# Altium footprint library 7-Connectors-7.PcbLib: 35 footprints (part 4 of 4) (continued)
## SAMTEC_ASP-134603-01 [mm] "Connector VITA 57 (Low Pin Count version), 160 Female contacts in 4 row cdgh" (continued)
  text "e" at 29.949,-0.836 h1
  text "d" at 29.989,-2.392 h1
  text "c" at 29.972,-3.556 h1
  text "b" at 29.972,-4.826 h1
  text "a" at 29.972,-6.096 h1
  text "f" at 30.116,0.436 h1
  text "h" at 29.972,2.921 h1
  text "g" at 29.862,1.579 h1
  text "j" at 29.989,4.246 h1
  text "k" at 29.989,5.516 h1
  text "40" at -26.289,-5.461 h1.2
  text "1" at 25.29,-7.438 h1
Mechanical 8:
  drawing of 1618 lines, arcs and shapes, not listed
Mechanical 14:
  drawing of 1424 lines, arcs and shapes, not listed
  text "a" at 29.972,-6.096 h1
  text "b" at 29.972,-4.826 h1
  text "c" at 29.972,-3.556 h1
  text "d" at 29.989,-2.392 h1
  text "e" at 29.949,-0.836 h1
  text "f" at 30.116,0.436 h1
  text "h" at 29.972,2.921 h1
  text "g" at 29.862,1.579 h1
  text "j" at 29.989,4.246 h1
  text "k" at 29.989,5.516 h1
  text "40" at -26.289,-5.461 h1.2
  text "1" at 25.29,-7.438 h1
3D body "SAMTEC_ASP-134603-01.stp": height 6.55, standoff -1.27, extent -28.727,-6.618 28.727,6.618

## SAMTEC_ASP-134604-01 [mm] "Connector VITA 57, 160 Male contacts in 4 row cdgh"
height 6.1
pads (162):
  round 1 hole 1.3 unplated mask+0.3: 1(-27.191,-3.048) 2(27.191,0)
  round 0.64 smd: c1(24.765,3.175) c2(23.495,3.175) c3(22.225,3.175) c4(20.955,3.175) c5(19.685,3.175) c6(18.415,3.175) c7(17.145,3.175) c8(15.875,3.175) c9(14.605,3.175) c10(13.335,3.175) c11(12.065,3.175) c12(10.795,3.175) c13(9.525,3.175) c14(8.255,3.175) c15(6.985,3.175) c16(5.715,3.175) c17(4.445,3.175) c18(3.175,3.175) c19(1.905,3.175) c20(0.635,3.175) c21(-0.635,3.175) c22(-1.905,3.175) c23(-3.175,3.175) c24(-4.445,3.175) c25(-5.715,3.175) c26(-6.985,3.175) c27(-8.255,3.175) c28(-9.525,3.175) c29(-10.795,3.175) c30(-12.065,3.175) c31(-13.335,3.175) c32(-14.605,3.175) c33(-15.875,3.175) c34(-17.145,3.175) c35(-18.415,3.175) c36(-19.685,3.175) c37(-20.955,3.175) c38(-22.225,3.175) c39(-23.495,3.175) c40(-24.765,3.175) d1(24.765,1.905) d2(23.495,1.905) d3(22.225,1.905) d4(20.955,1.905) d5(19.685,1.905) d6(18.415,1.905) d7(17.145,1.905) d8(15.875,1.905) d9(14.605,1.905) d10(13.335,1.905) d11(12.065,1.905) d12(10.795,1.905) d13(9.525,1.905) d14(8.255,1.905) d15(6.985,1.905) d16(5.715,1.905) d17(4.445,1.905) d18(3.175,1.905) d19(1.905,1.905) d20(0.635,1.905) d21(-0.635,1.905) d22(-1.905,1.905) d23(-3.175,1.905) d24(-4.445,1.905) d25(-5.715,1.905) d26(-6.985,1.905) d27(-8.255,1.905) d28(-9.525,1.905) d29(-10.795,1.905) d30(-12.065,1.905) d31(-13.335,1.905) d32(-14.605,1.905) d33(-15.875,1.905) d34(-17.145,1.905) d35(-18.415,1.905) d36(-19.685,1.905) d37(-20.955,1.905) d38(-22.225,1.905) d39(-23.495,1.905) d40(-24.765,1.905) g1(24.765,-1.905) g2(23.495,-1.905) g3(22.225,-1.905) g4(20.955,-1.905) g5(19.685,-1.905) g6(18.415,-1.905) g7(17.145,-1.905) g8(15.875,-1.905) g9(14.605,-1.905) g10(13.335,-1.905) g11(12.065,-1.905) g12(10.795,-1.905) g13(9.525,-1.905) g14(8.255,-1.905) g15(6.985,-1.905) g16(5.715,-1.905) g17(4.445,-1.905) g18(3.175,-1.905) g19(1.905,-1.905) g20(0.635,-1.905) g21(-0.635,-1.905) g22(-1.905,-1.905) g23(-3.175,-1.905) g24(-4.445,-1.905) g25(-5.715,-1.905) g26(-6.985,-1.905) g27(-8.255,-1.905) g28(-9.525,-1.905) g29(-10.795,-1.905) g30(-12.065,-1.905) g31(-13.335,-1.905) g32(-14.605,-1.905) g33(-15.875,-1.905) g34(-17.145,-1.905) g35(-18.415,-1.905) g36(-19.685,-1.905) g37(-20.955,-1.905) g38(-22.225,-1.905) g39(-23.495,-1.905) g40(-24.765,-1.905) h1(24.765,-3.175) h2(23.495,-3.175) h3(22.225,-3.175) h4(20.955,-3.175) h5(19.685,-3.175) h6(18.415,-3.175) h7(17.145,-3.175) h8(15.875,-3.175) h9(14.605,-3.175) h10(13.335,-3.175) h11(12.065,-3.175) h12(10.795,-3.175) h13(9.525,-3.175) h14(8.255,-3.175) h15(6.985,-3.175) h16(5.715,-3.175) h17(4.445,-3.175) h18(3.175,-3.175) h19(1.905,-3.175) h20(0.635,-3.175) h21(-0.635,-3.175) h22(-1.905,-3.175) h23(-3.175,-3.175) h24(-4.445,-3.175) h25(-5.715,-3.175) h26(-6.985,-3.175) h27(-8.255,-3.175) h28(-9.525,-3.175) h29(-10.795,-3.175) h30(-12.065,-3.175) h31(-13.335,-3.175) h32(-14.605,-3.175) h33(-15.875,-3.175) h34(-17.145,-3.175) h35(-18.415,-3.175) h36(-19.685,-3.175) h37(-20.955,-3.175) h38(-22.225,-3.175) h39(-23.495,-3.175) h40(-24.765,-3.175)
Top Overlay:
  drawing of 605 lines, arcs and shapes, not listed
  text "d" at 29.989,1.545 h1
  text "c" at 29.972,2.921 h1
  text "h" at 29.972,-3.556 h1
  text "g" at 29.862,-2.231 h1
  text "40" at -27.305,-7.112 h1
  text "1" at 25.417,-8.073 h1
Mechanical 8:
  drawing of 648 lines, arcs and shapes, not listed
Mechanical 14:
  drawing of 4433 lines, arcs and shapes, not listed
  text "c" at 29.972,2.921 h1
  text "d" at 29.989,1.545 h1
  text "h" at 29.972,-3.556 h1
  text "g" at 29.862,-2.231 h1
  text "40" at -27.305,-7.112 h1
  text "1" at 25.417,-8.073 h1
3D body "SAMTEC_ASP-134604-01.stp": height 5.61, standoff -1.27, extent -27.889,-7.341 28.778,7.341

## SAMTEC_SEAM-30-01-L-06-2-RA-TR [mm] "180 Contacts in 6 rows  (30 Pin per Row), Hi-Density Right Angle Open Pin Field Connector"
height 10.59
pads (186):
  rrect100% 0.84x0.64 smd: 1(-18.085,-0.762) 2(-18.085,1.397) 3(-18.085,2.667) 4(-18.085,3.937) 5(-18.085,5.207) 6(-18.085,6.477) 7(-16.815,-0.762) 8(-16.815,1.397) 9(-16.815,2.667) 10(-16.815,3.937) 11(-16.815,5.207) 12(-16.815,6.477) 13(-15.545,-0.762) 14(-15.545,1.397) 15(-15.545,2.667) 16(-15.545,3.937) 17(-15.545,5.207) 18(-15.545,6.477) 19(-14.275,-0.762) 20(-14.275,1.397) 21(-14.275,2.667) 22(-14.275,3.937) 23(-14.275,5.207) 24(-14.275,6.477) 25(-13.005,-0.762) 26(-13.005,1.397) 27(-13.005,2.667) 28(-13.005,3.937) 29(-13.005,5.207) 30(-13.005,6.477) 31(-11.735,-0.762) 32(-11.735,1.397) 33(-11.735,2.667) 34(-11.735,3.937) 35(-11.735,5.207) 36(-11.735,6.477) 37(-10.465,-0.762) 38(-10.465,1.397) 39(-10.465,2.667) 40(-10.465,3.937) 41(-10.465,5.207) 42(-10.465,6.477) 43(-9.195,-0.762) 44(-9.195,1.397) 45(-9.195,2.667) 46(-9.195,3.937) 47(-9.195,5.207) 48(-9.195,6.477) 49(-7.925,-0.762) 50(-7.925,1.397) 51(-7.925,2.667) 52(-7.925,3.937) 53(-7.925,5.207) 54(-7.925,6.477) 55(-6.655,-0.762) 56(-6.655,1.397) 57(-6.655,2.667) 58(-6.655,3.937) 59(-6.655,5.207) 60(-6.655,6.477) 61(-5.385,-0.762) 62(-5.385,1.397) 63(-5.385,2.667) 64(-5.385,3.937) 65(-5.385,5.207) 66(-5.385,6.477) 67(-4.115,-0.762) 68(-4.115,1.397) 69(-4.115,2.667) 70(-4.115,3.937) 71(-4.115,5.207) 72(-4.115,6.477) 73(-2.845,-0.762) 74(-2.845,1.397) 75(-2.845,2.667) 76(-2.845,3.937) 77(-2.845,5.207) 78(-2.845,6.477) 79(-1.575,-0.762) 80(-1.575,1.397) 81(-1.575,2.667) 82(-1.575,3.937) 83(-1.575,5.207) 84(-1.575,6.477) 85(-0.305,-0.762) 86(-0.305,1.397) 87(-0.305,2.667) 88(-0.305,3.937) 89(-0.305,5.207) 90(-0.305,6.477) 91(0.965,-0.762) 92(0.965,1.397) 93(0.965,2.667) 94(0.965,3.937) 95(0.965,5.207) 96(0.965,6.477) 97(2.235,-0.762) 98(2.235,1.397) 99(2.235,2.667) 100(2.235,3.937) 101(2.235,5.207) 102(2.235,6.477) 103(3.505,-0.762) 104(3.505,1.397) 105(3.505,2.667) 106(3.505,3.937) 107(3.505,5.207) 108(3.505,6.477) 109(4.775,-0.762) 110(4.775,1.397) 111(4.775,2.667) 112(4.775,3.937) 113(4.775,5.207) 114(4.775,6.477) 115(6.045,-0.762) 116(6.045,1.397) 117(6.045,2.667) 118(6.045,3.937) 119(6.045,5.207) 120(6.045,6.477) 121(7.315,-0.762) 122(7.315,1.397) 123(7.315,2.667) 124(7.315,3.937) 125(7.315,5.207) 126(7.315,6.477) 127(8.585,-0.762) 128(8.585,1.397) 129(8.585,2.667) 130(8.585,3.937) 131(8.585,5.207) 132(8.585,6.477) 133(9.855,-0.762) 134(9.855,1.397) 135(9.855,2.667) 136(9.855,3.937) 137(9.855,5.207) 138(9.855,6.477) 139(11.125,-0.762) 140(11.125,1.397) 141(11.125,2.667) 142(11.125,3.937) 143(11.125,5.207) 144(11.125,6.477) 145(12.395,-0.762) 146(12.395,1.397) 147(12.395,2.667) 148(12.395,3.937) 149(12.395,5.207) 150(12.395,6.477) 151(13.665,-0.762) 152(13.665,1.397) 153(13.665,2.667) 154(13.665,3.937) 155(13.665,5.207) 156(13.665,6.477) 157(14.935,-0.762) 158(14.935,1.397) 159(14.935,2.667) 160(14.935,3.937) 161(14.935,5.207) 162(14.935,6.477) 163(16.205,-0.762) 164(16.205,1.397) 165(16.205,2.667) 166(16.205,3.937) 167(16.205,5.207) 168(16.205,6.477) 169(17.475,-0.762) 170(17.475,1.397) 171(17.475,2.667) 172(17.475,3.937) 173(17.475,5.207) 174(17.475,6.477) 175(18.745,-0.762) 176(18.745,1.397) 177(18.745,2.667) 178(18.745,3.937) 179(18.745,5.207) 180(18.745,6.477)
  round 1 hole 1.3 unplated mask+0.15: MEC1(-21.715,0) MEC2(21.715,0)
  round 1 hole 1.15 unplated mask+0.075: MEC3(-22.735,5.134) MEC4(-22.735,-2.616) MEC5(22.735,5.134) MEC6(22.735,-2.616)
Top Overlay:
  drawing of 197 lines, arcs and shapes, not listed
  text "6" at -18.353,7.72 h1.2
  text "180" at 16.177,7.62 h1.2
  text "175" at 16.177,-2.98 h1.2
  text "1" at -18.253,-3.08 h1.2
Mechanical 8:
  drawing of 1656 lines, arcs and shapes, not listed
Mechanical 14:
  drawing of 286 lines, arcs and shapes, not listed
  text "6" at -18.353,7.72 h1.2
  text "180" at 16.177,7.62 h1.2
  text "175" at 16.177,-2.98 h1.2
  text "1" at -18.253,-3.08 h1.2
Mechanical 15:
  lines w0.05: -24.888,-9.077 -24.888,7.298 20.194,7.298 20.238,8.568 22.484,8.568 22.529,7.298 24.888,7.298 24.888,-9.077 -24.888,-9.077
3D body "SAMTEC_SEAM-30-01-L-06-2-RA-TR.stp": height 10.57, standoff -1.51, extent -24.638,-8.826 24.638,8.319

## SAMTEC_SEAM-30-03.0-L-06-2-A-K-TR [mm] "PISMO 2, VITA 57, VITA 57 Standard, 6 rows x 30 Columns, 180 contacts Male Connector"
height 6.6
pads (182):
  round 0.64 smd: 1(18.415,3.175) 2(18.415,1.905) 3(18.415,0.635) 4(18.415,-0.635) 5(18.415,-1.905) 6(18.415,-3.175) 7(17.145,3.175) 8(17.145,1.905) 9(17.145,0.635) 10(17.145,-0.635) 11(17.145,-1.905) 12(17.145,-3.175) 13(15.875,3.175) 14(15.875,1.905) 15(15.875,0.635) 16(15.875,-0.635) 17(15.875,-1.905) 18(15.875,-3.175) 19(14.605,3.175) 20(14.605,1.905) 21(14.605,0.635) 22(14.605,-0.635) 23(14.605,-1.905) 24(14.605,-3.175) 25(13.335,3.175) 26(13.335,1.905) 27(13.335,0.635) 28(13.335,-0.635) 29(13.335,-1.905) 30(13.335,-3.175) 31(12.065,3.175) 32(12.065,1.905) 33(12.065,0.635) 34(12.065,-0.635) 35(12.065,-1.905) 36(12.065,-3.175) 37(10.795,3.175) 38(10.795,1.905) 39(10.795,0.635) 40(10.795,-0.635) 41(10.795,-1.905) 42(10.795,-3.175) 43(9.525,3.175) 44(9.525,1.905) 45(9.525,0.635) 46(9.525,-0.635) 47(9.525,-1.905) 48(9.525,-3.175) 49(8.255,3.175) 50(8.255,1.905) 51(8.255,0.635) 52(8.255,-0.635) 53(8.255,-1.905) 54(8.255,-3.175) 55(6.985,3.175) 56(6.985,1.905) 57(6.985,0.635) 58(6.985,-0.635) 59(6.985,-1.905) 60(6.985,-3.175) 61(5.715,3.175) 62(5.715,1.905) 63(5.715,0.635) 64(5.715,-0.635) 65(5.715,-1.905) 66(5.715,-3.175) 67(4.445,3.175) 68(4.445,1.905) 69(4.445,0.635) 70(4.445,-0.635) 71(4.445,-1.905) 72(4.445,-3.175) 73(3.175,3.175) 74(3.175,1.905) 75(3.175,0.635) 76(3.175,-0.635) 77(3.175,-1.905) 78(3.175,-3.175) 79(1.905,3.175) 80(1.905,1.905) 81(1.905,0.635) 82(1.905,-0.635) 83(1.905,-1.905) 84(1.905,-3.175) 85(0.635,3.175) 86(0.635,1.905) 87(0.635,0.635) 88(0.635,-0.635) 89(0.635,-1.905) 90(0.635,-3.175) 91(-0.635,3.175) 92(-0.635,1.905) 93(-0.635,0.635) 94(-0.635,-0.635) 95(-0.635,-1.905) 96(-0.635,-3.175) 97(-1.905,3.175) 98(-1.905,1.905) 99(-1.905,0.635) 100(-1.905,-0.635) 101(-1.905,-1.905) 102(-1.905,-3.175) 103(-3.175,3.175) 104(-3.175,1.905) 105(-3.175,0.635) 106(-3.175,-0.635) 107(-3.175,-1.905) 108(-3.175,-3.175) 109(-4.445,3.175) 110(-4.445,1.905) 111(-4.445,0.635) 112(-4.445,-0.635) 113(-4.445,-1.905) 114(-4.445,-3.175) 115(-5.715,3.175) 116(-5.715,1.905) 117(-5.715,0.635) 118(-5.715,-0.635) 119(-5.715,-1.905) 120(-5.715,-3.175) 121(-6.985,3.175) 122(-6.985,1.905) 123(-6.985,0.635) 124(-6.985,-0.635) 125(-6.985,-1.905) 126(-6.985,-3.175) 127(-8.255,3.175) 128(-8.255,1.905) 129(-8.255,0.635) 130(-8.255,-0.635) 131(-8.255,-1.905) 132(-8.255,-3.175) 133(-9.525,3.175) 134(-9.525,1.905) 135(-9.525,0.635) 136(-9.525,-0.635) 137(-9.525,-1.905) 138(-9.525,-3.175) 139(-10.795,3.175) 140(-10.795,1.905) 141(-10.795,0.635) 142(-10.795,-0.635) 143(-10.795,-1.905) 144(-10.795,-3.175) 145(-12.065,3.175) 146(-12.065,1.905) 147(-12.065,0.635) 148(-12.065,-0.635) 149(-12.065,-1.905) 150(-12.065,-3.175) 151(-13.335,3.175) 152(-13.335,1.905) 153(-13.335,0.635) 154(-13.335,-0.635) 155(-13.335,-1.905) 156(-13.335,-3.175) 157(-14.605,3.175) 158(-14.605,1.905) 159(-14.605,0.635) 160(-14.605,-0.635) 161(-14.605,-1.905) 162(-14.605,-3.175) 163(-15.875,3.175) 164(-15.875,1.905) 165(-15.875,0.635) 166(-15.875,-0.635) 167(-15.875,-1.905) 168(-15.875,-3.175) 169(-17.145,3.175) 170(-17.145,1.905) 171(-17.145,0.635) 172(-17.145,-0.635) 173(-17.145,-1.905) 174(-17.145,-3.175) 175(-18.415,3.175) 176(-18.415,1.905) 177(-18.415,0.635) 178(-18.415,-0.635) 179(-18.415,-1.905) 180(-18.415,-3.175)
  round 1 hole 1.3 unplated mask+0.3: MEC1(-20.841,-3.05) MEC2(20.839,0)
Top Overlay:
  lines w0.2: -21.539,-3.672 -21.539,-4.039 -20.777,-4.801 -20.451,-4.801 ; -21.539,-2.428 -21.539,4.039 -20.777,4.801 20.777,4.801 21.539,4.039 21.539,0.62 ; -21.072,-2.144 -21.539,-1.676 -20.345,-1.676 ; -20.599,-1.676 -20.599,1.676 ; -20.548,-2.162 -20.382,-1.676 ; -20.382,1.676 -20.599,2.311 ; -20.382,3.2 -20.599,2.565 ; -20.345,-2.257 -20.345,3.2 ; -20.345,1.676 -21.539,1.676 -20.904,2.311 ; -20.345,2.946 -19.035,2.946 ; -19.918,-3.2 -19.035,-3.2 ; -19.912,-2.946 -19.035,-2.946 ; -19.035,-2.007 -20.066,-2.007 ; -19.035,-1.88 -19.939,-1.88 ; -19.035,-0.66 -19.939,-0.66 ; -19.035,-0.533 -20.066,-0.533 ; -19.035,0.533 -20.066,0.533 ; -19.035,0.66 -19.939,0.66 ; -19.035,1.88 -19.939,1.88 ; -19.035,2.007 -20.066,2.007 ; -19.035,3.2 -21.539,3.2 -20.904,2.565 ; -16.549,-4.801 20.777,-4.801 21.539,-4.039 21.539,-0.62 ; 19.035,-3.2 20.599,-3.2 ; 19.035,-2.946 20.345,-2.946 ; 19.035,-2.007 19.431,-2.007 ; 19.035,-1.88 19.304,-1.88 ; 19.035,-0.66 19.304,-0.66 ; 19.035,-0.533 19.431,-0.533 ; 19.035,0.533 19.431,0.533 ; 19.035,0.66 19.304,0.66 ; 19.035,1.88 19.304,1.88 ; 19.035,2.007 19.431,2.007 ; 19.035,2.946 20.345,2.946 ; 19.035,3.2 20.599,3.2 ; 20.345,-2.007 21.539,-2.007 20.904,-1.372 ; 20.345,-0.794 20.345,-2.946 ; 20.345,0.794 20.345,2.946 ; 20.345,2.007 21.539,2.007 20.904,1.372 ; 20.382,-2.007 20.599,-1.372 ; 20.382,2.007 20.599,1.372 ; 20.599,-2.007 20.599,-3.2 ; 20.599,-0.904 20.599,-1.372 ; 20.599,0.904 20.599,1.372 ; 20.599,2.007 20.599,3.2 ; 20.904,-0.933 20.904,-1.372 ; 20.904,0.933 20.904,1.372 ; 21.539,0.762 22.428,0.762 22.428,-0.762 21.54,-0.762 ; -20.904,2.311 -20.904,2.565 ; -20.904,2.311 -20.599,2.311 ; -20.904,2.565 -20.599,2.565 ; -20.599,2.311 -20.599,2.565 ; -20.066,-2.007 -19.939,-1.88 ; -20.066,-2.007 -20.066,-0.533 ; -20.066,-0.533 -19.939,-0.66 ; -20.066,0.533 -19.939,0.66 ; -20.066,0.533 -20.066,2.007 ; -20.066,2.007 -19.939,1.88 ; -19.939,-1.88 -19.939,-0.66 ; -19.939,0.66 -19.939,1.88 ; 19.304,-1.88 19.304,-0.66 ; 19.304,-1.88 19.431,-2.007 ; 19.304,-0.66 19.431,-0.533 ; 19.304,0.66 19.431,0.533 ; 19.304,0.66 19.304,1.88 ; 19.304,1.88 19.431,2.007 ; 19.431,-2.007 19.431,-0.533 ; 19.431,0.533 19.431,2.007 ; 20.345,-2.946 20.599,-3.2 ; 20.345,2.946 20.599,3.2 ; 20.599,-1.372 20.904,-1.372 ; 20.599,1.372 20.904,1.372
  text "1" at 18.919,3.935 h1
  text "180" at -19.74,-4.969 h1
Mechanical 8:
  drawing of 739 lines, arcs and shapes, not listed
Mechanical 14:
  lines w0.1: -20.599,-1.676 -20.599,1.676 ; -20.451,-4.801 -20.777,-4.801 -21.539,-4.039 -21.539,4.039 -20.777,4.801 20.777,4.801 21.539,4.039 21.539,-4.039 20.777,-4.801 -16.549,-4.801 ; -20.382,-3.2 -20.599,-2.565 ; -20.382,-1.676 -20.599,-2.311 ; -20.382,1.676 -20.599,2.311 ; -20.382,3.2 -20.599,2.565 ; -20.345,-3.2 -20.345,3.2 ; -20.345,-2.946 20.345,-2.946 ; -20.345,-1.676 -21.539,-1.676 -20.904,-2.311 ; -20.345,1.676 -21.539,1.676 -20.904,2.311 ; -20.345,2.946 20.345,2.946 ; -18.694,-3.2 -18.694,-3.251 -18.136,-3.251 -18.136,-3.2 ; -18.694,-1.88 -18.694,-1.829 -18.136,-1.829 -18.136,-1.88 ; -18.694,-0.66 -18.694,-0.711 -18.136,-0.711 -18.136,-0.66 ; -18.694,0.66 -18.694,0.711 -18.136,0.711 -18.136,0.66 ; -18.694,1.88 -18.694,1.829 -18.136,1.829 -18.136,1.88 ; -18.694,3.2 -18.694,3.251 -18.136,3.251 -18.136,3.2 ; 18.136,-3.2 18.136,-3.251 18.694,-3.251 18.694,-3.2 ; 18.136,-1.88 18.136,-1.829 18.694,-1.829 18.694,-1.88 ; 18.136,-0.66 18.136,-0.711 18.694,-0.711 18.694,-0.66 ; 18.136,0.66 18.136,0.711 18.694,0.711 18.694,0.66 ; 18.136,1.88 18.136,1.829 18.694,1.829 18.694,1.88 ; 18.136,3.2 18.136,3.251 18.694,3.251 18.694,3.2 ; 20.345,-2.007 21.539,-2.007 20.904,-1.372 ; 20.345,2.007 21.539,2.007 20.904,1.372 ; 20.382,-2.007 20.599,-1.372 ; 20.382,2.007 20.599,1.372 ; 20.599,-2.007 20.599,-3.2 ; 20.599,2.007 20.599,3.2 ; 21.539,0.762 22.428,0.762 22.428,-0.762 21.54,-0.762 ; -20.904,-2.565 -21.539,-3.2 20.599,-3.2 ; -20.904,-2.565 -20.599,-2.565 ; -20.904,-2.565 -20.904,-2.311 ; -20.904,-2.311 -20.599,-2.311 ; -20.904,2.311 -20.904,2.565 ; -20.904,2.311 -20.599,2.311 ; -20.904,2.565 -20.599,2.565 ; -20.904,2.565 -21.539,3.2 20.599,3.2 ; -20.599,-2.565 -20.599,-2.311 ; -20.599,2.311 -20.599,2.565 ; -20.066,-2.007 -19.939,-1.88 ; -20.066,-2.007 -20.066,-0.533 ; -20.066,-2.007 19.431,-2.007 ; -20.066,-0.533 -19.939,-0.66 ; -20.066,-0.533 19.431,-0.533 ; -20.066,0.533 -19.939,0.66 ; -20.066,0.533 -20.066,2.007 ; -20.066,0.533 19.431,0.533 ; -20.066,2.007 -19.939,1.88 ; -20.066,2.007 19.431,2.007 ; -19.939,-1.88 19.304,-1.88 ; -19.939,-1.88 -19.939,-0.66 ; -19.939,-0.66 19.304,-0.66 ; -19.939,0.66 -19.939,1.88 ; -19.939,0.66 19.304,0.66 ; -19.939,1.88 19.304,1.88 ; 19.304,-1.88 19.304,-0.66 ; 19.304,-1.88 19.431,-2.007 ; 19.304,-0.66 19.431,-0.533 ; 19.304,0.66 19.431,0.533 ; 19.304,0.66 19.304,1.88 ; 19.304,1.88 19.431,2.007 ; 19.431,-2.007 19.431,-0.533 ; 19.431,0.533 19.431,2.007 ; 20.345,-2.946 20.599,-3.2 ; 20.345,-2.946 20.345,2.946 ; 20.345,2.946 20.599,3.2 ; 20.599,-1.372 20.599,1.372 ; 20.599,-1.372 20.904,-1.372 ; 20.599,1.372 20.904,1.372 ; 20.904,-1.372 20.904,1.372
  text "1" at 18.919,3.935 h1
  text "180" at -19.74,-4.969 h1
Mechanical 15:
  lines w0.05: -21.79,-5.05 21.79,-5.05 21.79,-1.012 22.678,-1.012 22.678,1.012 21.79,1.012 21.79,5.05 -21.79,5.05 -21.79,-5.05
3D body "SEAM-30-03.0-L-06-2-A-K-TR.stp": height 6.6, standoff -1.27, extent -21.539,-4.801 22.428,4.801

## TP [mm]
height 11.7
pads (1):
  round 2 smd mask+1: W(0,0)
Top Overlay:
  circle w0.254: c0,0 r2.195
Keep-Out Layer:
  circle w0.025: c0,0 r2.017
3D body "1_016-1_016-3_tp.stp": height 0.02, standoff 0, extent -1.5,-1.5 1.5,1.5

## TYCO_1-822473-1 [mm] "20 Leads PLCC Socket, Pitch 1.27 mm, Body 15.56x15.56mm"
height 8.1
pads (20):
  rect 1.6x1.6 hole 0.9: 1(0,5.08)
  round 1.6 hole 0.9: 2(0,2.54) 3(-2.54,5.08) 4(-5.08,2.54) 5(-2.54,2.54) 6(-5.08,0) 7(-2.54,0) 8(-5.08,-2.54) 9(-2.54,-5.08) 10(-2.54,-2.54) 11(0,-5.08) 12(0,-2.54) 13(2.54,-5.08) 14(5.08,-2.54) 15(2.54,-2.54) 16(5.08,0) 17(2.54,0) 18(5.08,2.54) 19(2.54,5.08) 20(2.54,2.54)
Top Overlay:
  circle w0.25: c0,8.375 r0.125
  lines w0.2: -7.78,-7.78 -7.78,6.33 -6.33,7.78 7.78,7.78 7.78,-7.78 -7.78,-7.78 ; -6.882,5.588 -5.574,6.896 -4.266,5.588 -5.574,4.28 -6.882,5.588
Mechanical 8:
  lines w0.1: -5.58,-2.54 -5.08,-2.54 ; -5.58,0 -5.08,0 ; -5.58,2.54 -5.08,2.54 ; -5.08,-3.04 -5.08,-2.54 ; -5.08,-2.04 -5.08,-2.54 ; -5.08,-0.5 -5.08,0 ; -5.08,0.5 -5.08,0 ; -5.08,2.04 -5.08,2.54 ; -5.08,3.04 -5.08,2.54 ; -4.58,-2.54 -5.08,-2.54 ; -4.58,0 -5.08,0 ; -4.58,2.54 -5.08,2.54 ; -3.04,-5.08 -2.54,-5.08 ; -3.04,-2.54 -2.54,-2.54 ; -3.04,0 -2.54,0 ; -3.04,2.54 -2.54,2.54 ; -3.04,5.08 -2.54,5.08 ; -2.54,-5.58 -2.54,-5.08 ; -2.54,-4.58 -2.54,-5.08 ; -2.54,-3.04 -2.54,-2.54 ; -2.54,-2.04 -2.54,-2.54 ; -2.54,-0.5 -2.54,0 ; -2.54,0.5 -2.54,0 ; -2.54,2.04 -2.54,2.54 ; -2.54,3.04 -2.54,2.54 ; -2.54,4.58 -2.54,5.08 ; -2.54,5.58 -2.54,5.08 ; -2.04,-5.08 -2.54,-5.08 ; -2.04,-2.54 -2.54,-2.54 ; -2.04,0 -2.54,0 ; -2.04,2.54 -2.54,2.54 ; -2.04,5.08 -2.54,5.08 ; -0.5,-5.08 0,-5.08 ; -0.5,-2.54 0,-2.54 ; -0.5,0 0,0 ; -0.5,2.54 0,2.54 ; -0.5,5.08 0,5.08 ; 0,-5.58 0,-5.08 ; 0,-4.58 0,-5.08 ; 0,-3.04 0,-2.54 ; 0,-2.04 0,-2.54 ; 0,-0.5 0,0 ; 0,0.5 0,0 ; 0,2.04 0,2.54 ; 0,3.04 0,2.54 ; 0,4.58 0,5.08 ; 0,5.58 0,5.08 ; 0.5,-5.08 0,-5.08 ; 0.5,-2.54 0,-2.54 ; 0.5,0 0,0 ; 0.5,2.54 0,2.54 ; 0.5,5.08 0,5.08 ; 2.04,-5.08 2.54,-5.08 ; 2.04,-2.54 2.54,-2.54 ; 2.04,0 2.54,0 ; 2.04,2.54 2.54,2.54 ; 2.04,5.08 2.54,5.08 ; 2.54,-5.58 2.54,-5.08 ; 2.54,-4.58 2.54,-5.08 ; 2.54,-3.04 2.54,-2.54 ; 2.54,-2.04 2.54,-2.54 ; 2.54,-0.5 2.54,0 ; 2.54,0.5 2.54,0 ; 2.54,2.04 2.54,2.54 ; 2.54,3.04 2.54,2.54 ; 2.54,4.58 2.54,5.08 ; 2.54,5.58 2.54,5.08 ; 3.04,-5.08 2.54,-5.08 ; 3.04,-2.54 2.54,-2.54 ; 3.04,0 2.54,0 ; 3.04,2.54 2.54,2.54 ; 3.04,5.08 2.54,5.08 ; 4.58,-2.54 5.08,-2.54 ; 4.58,0 5.08,0 ; 4.58,2.54 5.08,2.54 ; 5.08,-3.04 5.08,-2.54 ; 5.08,-2.04 5.08,-2.54 ; 5.08,-0.5 5.08,0 ; 5.08,0.5 5.08,0 ; 5.08,2.04 5.08,2.54 ; 5.08,3.04 5.08,2.54 ; 5.58,-2.54 5.08,-2.54 ; 5.58,0 5.08,0 ; 5.58,2.54 5.08,2.54
Mechanical 14:
  lines w0.1: -5.09,-4.135 -5.09,3.685 -4.59,3.685 -3.635,4.64 -3.635,5.14 4.185,5.14 ; -5.09,-2.794 -4.323,-2.794 -4.323,-2.286 -5.09,-2.286 ; -5.09,-1.524 -4.323,-1.524 -4.323,-1.016 -5.09,-1.016 ; -5.09,-0.254 -4.323,-0.254 -4.323,0.254 -5.09,0.254 ; -5.09,1.016 -4.323,1.016 -4.323,1.524 -5.09,1.524 ; -5.09,2.286 -4.323,2.286 -4.323,2.794 -5.09,2.794 ; -4.185,-5.14 5.09,-5.14 5.09,4.135 ; -2.794,-5.14 -2.794,-4.323 -2.286,-4.323 -2.286,-5.14 ; -2.794,5.14 -2.794,4.323 -2.286,4.323 -2.286,5.14 ; -1.524,-5.14 -1.524,-4.323 -1.016,-4.323 -1.016,-5.14 ; -1.524,5.14 -1.524,4.323 -1.016,4.323 -1.016,5.14 ; -0.254,-5.14 -0.254,-4.323 0.254,-4.323 0.254,-5.14 ; -0.254,5.14 -0.254,4.323 0.254,4.323 0.254,5.14 ; 1.016,-5.14 1.016,-4.323 1.524,-4.323 1.524,-5.14 ; 1.016,5.14 1.016,4.323 1.524,4.323 1.524,5.14 ; 2.286,-5.14 2.286,-4.323 2.794,-4.323 2.794,-5.14 ; 2.286,5.14 2.286,4.323 2.794,4.323 2.794,5.14 ; 3.93,-5.405 5.332,-5.405 5.332,-4.003 6.64,-5.311 5.261,-6.69 3.953,-5.382 ; 5.09,-2.794 4.323,-2.794 4.323,-2.286 5.09,-2.286 ; 5.09,-1.524 4.323,-1.524 4.323,-1.016 5.09,-1.016 ; 5.09,-0.254 4.323,-0.254 4.323,0.254 5.09,0.254 ; 5.09,1.016 4.323,1.016 4.323,1.524 5.09,1.524 ; 5.09,2.286 4.323,2.286 4.323,2.794 5.09,2.794 ; -7.78,-7.78 -7.78,6.33 -6.33,7.78 7.78,7.78 7.78,-7.78 -7.78,-7.78 ; -6.882,5.588 -5.574,6.896 -4.266,5.588 -5.574,4.28 -6.882,5.588 ; -6.558,-5.604 -5.604,-6.558 -3.253,-4.207 -3.253,-3.253 -4.207,-3.253 -6.558,-5.604 ; -1,2.54 -0.5,2.54 -0.5,1.54 0.5,1.54 0.5,2.54 1,2.54 0,3.54 -1,2.54 ; 3.253,3.253 4.207,3.253 6.558,5.604 5.604,6.558 3.253,4.207 3.253,3.253
3D body "TYCO_1-822473-1.stp": height 8.55, standoff -3.2, extent -7.78,-7.78 7.78,7.78

## WEIDMULLER_1146740000 [mm] "15A 300 V, Pitch 5.08mm, 3 Positions PCB Right Angle Male Header, BL/SL 5.08 serie"
height 8.5
pads (3):
  round 2.1 hole 1.4: 1(-5.08,0) 2(0,0) 3(5.08,0)
Top Overlay:
  lines w0.2: -7.52,-7.15 7.52,-7.15 ; -7.52,-6.83 7.52,-6.83 ; -7.52,-4.68 7.52,-4.68 ; -7.52,-3.93 7.52,-3.93 ; -6.25,-6.83 -6.25,-5.8 -3.91,-5.8 -3.91,-6.83 ; -6,-6.83 -6,-5.8 ; -5.58,-6.83 -5.58,-5.8 ; -4.58,-6.83 -4.58,-5.8 ; -4.16,-6.83 -4.16,-5.8 ; -1.17,-6.83 -1.17,-5.8 1.17,-5.8 1.17,-6.83 ; -0.92,-6.83 -0.92,-5.8 ; -0.5,-6.83 -0.5,-5.8 ; 0.5,-6.83 0.5,-5.8 ; 0.92,-6.83 0.92,-5.8 ; 3.91,-6.83 3.91,-5.8 6.25,-5.8 6.25,-6.83 ; 4.16,-6.83 4.16,-5.8 ; 4.58,-6.83 4.58,-5.8 ; 5.58,-6.83 5.58,-5.8 ; 6,-6.83 6,-5.8 ; -7.52,-9.95 7.52,-9.95 7.52,2.05 -7.52,2.05 -7.52,-9.95
  text "1" at -5.35,2.625 h1
Mechanical 8:
  lines w0.1: -5.58,0 -5.08,0 ; -5.08,-0.5 -5.08,0 ; -5.08,0.5 -5.08,0 ; -4.58,0 -5.08,0 ; -0.5,0 0,0 ; 0,-0.5 0,0 ; 0,0.5 0,0 ; 0.5,0 0,0 ; 4.58,0 5.08,0 ; 5.08,-0.5 5.08,0 ; 5.08,0.5 5.08,0 ; 5.58,0 5.08,0
Mechanical 14:
  lines w0.1: -7.52,-7.15 7.52,-7.15 ; -7.52,-6.83 7.52,-6.83 ; -7.52,-4.68 7.52,-4.68 ; -7.52,-3.93 7.52,-3.93 ; -6.25,-6.83 -6.25,-5.8 -3.91,-5.8 -3.91,-6.83 ; -6,-6.83 -6,-5.8 ; -5.58,-6.83 -5.58,-5.8 ; -4.58,-6.83 -4.58,-5.8 ; -4.16,-6.83 -4.16,-5.8 ; -1.17,-6.83 -1.17,-5.8 1.17,-5.8 1.17,-6.83 ; -0.92,-6.83 -0.92,-5.8 ; -0.5,-6.83 -0.5,-5.8 ; 0.5,-6.83 0.5,-5.8 ; 0.92,-6.83 0.92,-5.8 ; 3.91,-6.83 3.91,-5.8 6.25,-5.8 6.25,-6.83 ; 4.16,-6.83 4.16,-5.8 ; 4.58,-6.83 4.58,-5.8 ; 5.58,-6.83 5.58,-5.8 ; 6,-6.83 6,-5.8 ; -7.52,-9.95 7.52,-9.95 7.52,2.05 -7.52,2.05 -7.52,-9.95
  text "3" at 4.74,-2.65 h1
  text "2" at -0.34,-2.65 h1
  text "1" at -5.42,-2.65 h1
3D body "WEIDMULLER_1146740000.stp": height 8.43, standoff -3.2, extent -7.52,-9.95 7.52,2.05

## WEIDMULLER_1622960000 [mm] "23A 400 V, Pitch 5.08mm, 4 Positions PCB Female Header, BL/SL 5.08 series"
height 10.3
pads (8):
  round 2.1 hole 1.4: 1(-7.62,-2.54) 1(-7.62,2.54) 2(-2.54,-2.54) 2(-2.54,2.54) 3(2.54,-2.54) 3(2.54,2.54) 4(7.62,-2.54) 4(7.62,2.54)
Top Overlay:
  lines w0.2: -10.16,7.84 -6.58,7.84 ; -5.08,7.84 5.08,7.84 ; 6.58,7.84 10.16,7.84 ; 6.58,12.073 5.08,12.073 5.08,3.74 6.58,3.74 6.58,12.08 ; -10.16,-4.06 10.16,-4.06 10.16,16.19 -10.16,16.19 -10.16,-4.06 ; -6.58,3.74 -5.08,3.74 -5.08,12.073 -6.58,12.073 -6.58,3.74
  text "4" at 7.293,-0.66 h1.2
  text "3" at 2.213,-0.66 h1.2
  text "2" at -2.867,-0.66 h1.2
  text "1" at -7.872,-0.66 h1.2
Mechanical 8:
  lines w0.1: -8.12,-2.54 -7.62,-2.54 ; -8.12,2.54 -7.62,2.54 ; -7.62,-3.04 -7.62,-2.54 ; -7.62,-2.04 -7.62,-2.54 ; -7.62,2.04 -7.62,2.54 ; -7.62,3.04 -7.62,2.54 ; -7.12,-2.54 -7.62,-2.54 ; -7.12,2.54 -7.62,2.54 ; -3.04,-2.54 -2.54,-2.54 ; -3.04,2.54 -2.54,2.54 ; -2.54,-3.04 -2.54,-2.54 ; -2.54,-2.04 -2.54,-2.54 ; -2.54,2.04 -2.54,2.54 ; -2.54,3.04 -2.54,2.54 ; -2.04,-2.54 -2.54,-2.54 ; -2.04,2.54 -2.54,2.54 ; -0.5,0 0,0 ; 0,-0.5 0,0 ; 0,0.5 0,0 ; 0.5,0 0,0 ; 2.04,-2.54 2.54,-2.54 ; 2.04,2.54 2.54,2.54 ; 2.54,-3.04 2.54,-2.54 ; 2.54,-2.04 2.54,-2.54 ; 2.54,2.04 2.54,2.54 ; 2.54,3.04 2.54,2.54 ; 3.04,-2.54 2.54,-2.54 ; 3.04,2.54 2.54,2.54 ; 7.12,-2.54 7.62,-2.54 ; 7.12,2.54 7.62,2.54 ; 7.62,-3.04 7.62,-2.54 ; 7.62,-2.04 7.62,-2.54 ; 7.62,2.04 7.62,2.54 ; 7.62,3.04 7.62,2.54 ; 8.12,-2.54 7.62,-2.54 ; 8.12,2.54 7.62,2.54
Mechanical 14:
  lines w0.1: -10.16,7.84 -6.58,7.84 ; -5.08,7.84 5.08,7.84 ; 6.58,7.84 10.16,7.84 ; 6.58,12.073 5.08,12.073 5.08,3.74 6.58,3.74 6.58,12.08 ; -10.16,-4.06 -10.16,16.19 10.16,16.19 10.16,-4.06 -10.16,-4.06 ; -6.58,3.74 -6.58,12.073 -5.08,12.073 -5.08,3.74 -6.58,3.74
  text "4" at 7.293,-0.66 h1.2
  text "3" at 2.213,-0.66 h1.2
  text "2" at -2.867,-0.66 h1.2
  text "1" at -7.872,-0.66 h1.2
3D body "WEIDMULLER_1622960000.stp": height 10.28, standoff -3.2, extent -10.16,-4.06 10.16,16.19